# Altium footprint library MyPcbLib.PcbLib: 237 footprints (part 3 of 15)
Each footprint in its own frame and in the unit in brackets; x right, y up, seen from the top. Pads: shape width x height; smd on the part's side, far side on the other; paste and mask are expansions set on the pad; w line width, h text height; cw(c..) or ccw(c..) is an arc to the next point about the centre after c.
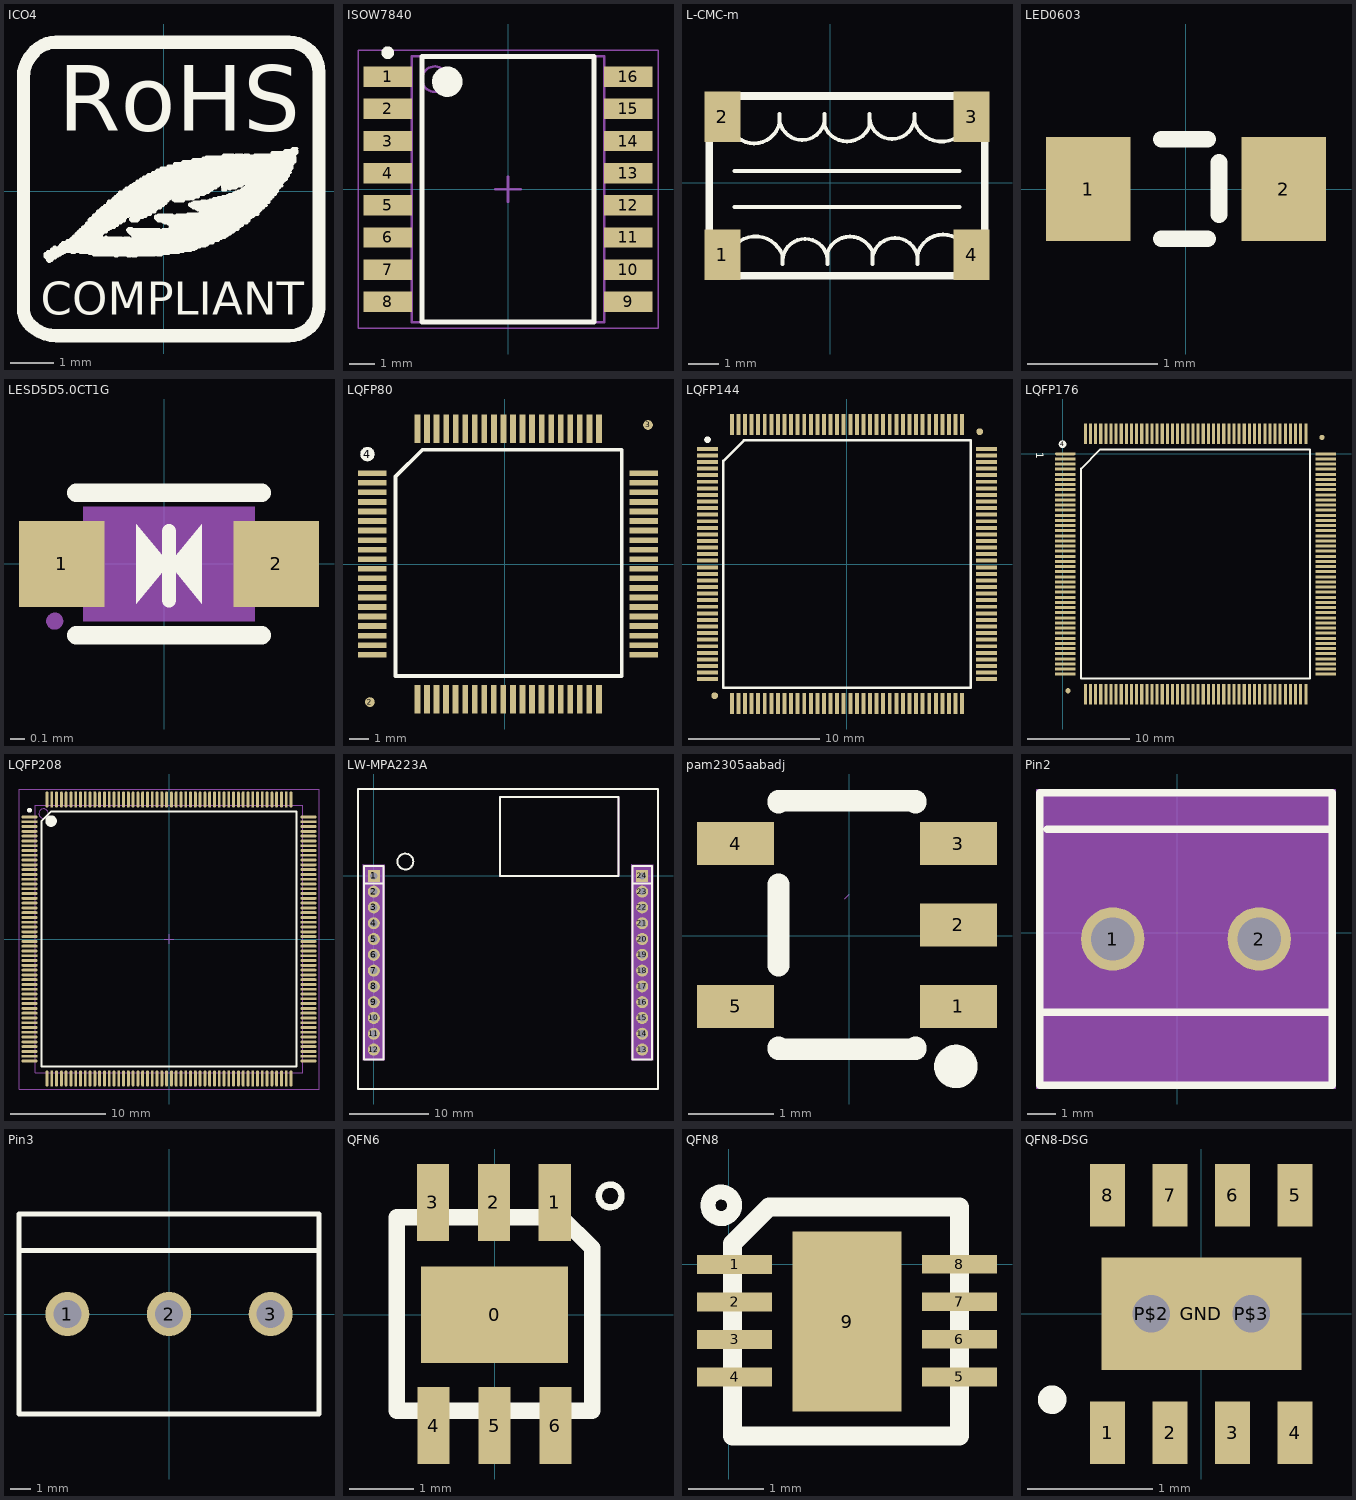
[diagram p2: the footprints below, top view; thin cyan lines are the x and y axes]

## ICO4 [mm]
Top Overlay:
  drawing of 1541 lines, arcs and shapes, not listed
  text "COMPLIANT" at -2.845,-2.869 h0.76
  text "RoHS" at -2.438,1.398 h1.52

## ISOW7840 [mm] "SOIC, 16-Leads, Body 10.30x7.50mm, Pitch 1.27mm, IPC Medium Density"
height 2.65
pads (16):
  rect 1.9x0.8 smd: 1(-4.75,4.445) 2(-4.75,3.175) 3(-4.75,1.905) 4(-4.75,0.635) 5(-4.75,-0.635) 6(-4.75,-1.905) 7(-4.75,-3.175) 8(-4.75,-4.445) 9(4.75,-4.445) 10(4.75,-3.175) 11(4.75,-1.905) 12(4.75,-0.635) 13(4.75,0.635) 14(4.75,1.905) 15(4.75,3.175) 16(4.75,4.445)
Top Overlay:
  circle w0.25: c-4.75,5.395 r0.125
  circle w0.6: c-2.4,4.25 r0.3
  lines w0.2: -3.4,-5.25 -3.4,5.25 3.4,5.25 3.4,-5.25 -3.4,-5.25
Mechanical 2:
  circle w0.1: c-2.9,4.35 r0.5
  lines w0.1: -3.8,-5.25 -3.8,5.25 3.8,5.25 3.8,-5.25 -3.8,-5.25
Mechanical 6:
  lines w0.05: -5.925,-5.5 -5.925,5.5 5.925,5.5 5.925,-5.5 -5.925,-5.5
  lines w0.1: -0.5,0 0.5,0 ; 0,-0.5 0,0.5
3D body: height 2.65, standoff 0.1, extent -3.8,-5.25 3.8,5.25

## L-CMC-m [mm]
pads (4):
  rect 1.194x1.694 smd: 1(-3.6,-2.4) 2(-3.6,2.2) 3(4.708,2.2) 4(4.708,-2.4)
Top Overlay:
  lines w0.127: -3.394,-2.748 -3.394,-2.433 cw(c-2.494,-2.734) -1.594,-2.433 -1.594,-2.708 cw(c-0.844,-2.625) -0.094,-2.708 -0.094,-2.308 ; -3.394,2.459 -3.394,1.992 ccw(c-2.544,2.182) -1.694,1.992 -1.694,2.292 ccw(c-0.944,2.183) -0.194,2.292 -0.194,1.892 ; -3.194,-0.808 4.306,-0.808 ; -3.194,0.392 4.306,0.392 ; -0.194,1.891 ccw(c0.556,2.182) 1.306,1.893 1.306,2.292 ccw(c2.056,2.209) 2.806,2.292 2.806,2.017 ; -0.094,-2.308 cw(c0.656,-2.598) 1.405,-2.307 1.406,-2.708 cw(c2.156,-2.598) 2.906,-2.708 2.906,-2.407 cw(c3.756,-2.597) 4.606,-2.407 4.606,-2.748 ; 2.806,2.016 ccw(c3.706,2.317) 4.606,2.018 ; 4.606,2.017 4.606,2.459
  lines w0.254: -4.042,-3.103 5.152,-3.103 5.152,2.891 -4.042,2.891 -4.042,-3.103

## LED0603 [mm]
pads (2):
  rect 0.65x0.8 smd: 1(-0.75,0) 2(0.75,0)
Top Overlay:
  lines w0.127: -0.19,-0.383 0.165,-0.383 ; -0.19,0.383 0.165,0.383 ; 0.253,-0.196 0.253,0.204
3D body "LED-0603.STEP": height 0.52, standoff -0.03, extent -0.851,-0.387 0.8,0.413

## LESD5D5.0CT1G [mm]
pads (2):
  rect 0.6x0.6 smd: 1(-0.716,0) 2(0.784,0)
Top Overlay:
  region: 0.034,0 -0.195,-0.279 -0.195,0.279
  region: 0.034,0 0.263,0.279 0.263,-0.279
  lines w0.1: 0.034,-0.254 0.034,0.229
  lines w0.13: -0.616,-0.5 0.684,-0.5 ; -0.616,0.5 0.684,0.5
Mechanical 4:
  region: -0.566,-0.4 -0.566,0.4 0.634,0.4 0.634,-0.4
Mechanical 5:
  region: -0.766,0.15 -0.429,0.15 -0.429,-0.15 -0.766,-0.15
  region: 0.834,-0.152 0.497,-0.152 0.497,0.148 0.834,0.148
Mechanical 6:
  circle w0.06: c-0.766,-0.4 r0.03
Mechanical 15:
  region: 0.263,0.279 0.263,-0.279 0.034,0
  region: -0.195,0.279 -0.195,-0.279 0.034,0

## LQFP80 [mm]
pads (83):
  rect 1.5x0.3 smd: 1(-6.934,4.763) 2(-6.934,4.263) 3(-6.934,3.763) 4(-6.934,3.263) 5(-6.934,2.763) 6(-6.934,2.263) 7(-6.934,1.763) 8(-6.934,1.263) 9(-6.934,0.763) 10(-6.934,0.263) 11(-6.934,-0.237) 12(-6.934,-0.737) 13(-6.934,-1.237) 14(-6.934,-1.737) 15(-6.934,-2.237) 16(-6.934,-2.737) 17(-6.934,-3.237) 18(-6.934,-3.737) 19(-6.934,-4.237) 20(-6.934,-4.737) 41(7.266,-4.737) 42(7.266,-4.237) 43(7.266,-3.737) 44(7.266,-3.237) 45(7.266,-2.737) 46(7.266,-2.237) 47(7.266,-1.737) 48(7.266,-1.237) 49(7.266,-0.737) 50(7.266,-0.237) 51(7.266,0.263) 52(7.266,0.763) 53(7.266,1.263) 54(7.266,1.763) 55(7.266,2.263) 56(7.266,2.763) 57(7.266,3.263) 58(7.266,3.763) 59(7.266,4.263) 60(7.266,4.763)
  round 0.508 smd: 2(-7.061,-7.214) 3(7.493,7.29)
  round 0.762 on Top Overlay: 4(-7.188,5.766)
  rect 0.3x1.5 smd: 21(-4.576,-7.074) 22(-4.076,-7.074) 23(-3.576,-7.074) 24(-3.076,-7.074) 25(-2.576,-7.074) 26(-2.076,-7.074) 27(-1.576,-7.074) 28(-1.076,-7.074) 29(-0.576,-7.074) 30(-0.076,-7.074) 31(0.424,-7.074) 32(0.924,-7.074) 33(1.424,-7.074) 34(1.924,-7.074) 35(2.424,-7.074) 36(2.924,-7.074) 37(3.424,-7.074) 38(3.924,-7.074) 39(4.424,-7.074) 40(4.924,-7.074) 61(4.928,7.099) 62(4.428,7.099) 63(3.928,7.099) 64(3.428,7.099) 65(2.928,7.099) 66(2.428,7.099) 67(1.928,7.099) 68(1.428,7.099) 69(0.928,7.099) 70(0.428,7.099) 71(-0.072,7.099) 72(-0.572,7.099) 73(-1.072,7.099) 74(-1.572,7.099) 75(-2.072,7.099) 76(-2.572,7.099) 77(-3.072,7.099) 78(-3.572,7.099) 79(-4.072,7.099) 80(-4.572,7.099)
Top Overlay:
  lines w0.2: -5.715,-5.855 6.121,-5.855 6.121,5.994 -4.305,5.994 -5.715,4.585 -5.715,-5.855
3D body "LQFP-80.step": height 1.73, standoff 0.09, extent -6.936,-7.087 7.264,7.113

## LQFP144 [mm]
pads (146):
  rect 1.6x0.3 smd: 1(-10.6,8.75) 2(-10.6,8.25) 3(-10.6,7.75) 4(-10.6,7.25) 5(-10.6,6.75) 6(-10.6,6.25) 7(-10.6,5.75) 8(-10.6,5.25) 9(-10.6,4.75) 10(-10.6,4.25) 11(-10.6,3.75) 12(-10.6,3.25) 13(-10.6,2.75) 14(-10.6,2.25) 15(-10.6,1.75) 16(-10.6,1.25) 17(-10.6,0.75) 18(-10.6,0.25) 19(-10.6,-0.25) 20(-10.6,-0.75) 21(-10.6,-1.25) 22(-10.6,-1.75) 23(-10.6,-2.25) 24(-10.6,-2.75) 25(-10.6,-3.25) 26(-10.6,-3.75) 27(-10.6,-4.25) 28(-10.6,-4.75) 29(-10.6,-5.25) 30(-10.6,-5.75) 31(-10.6,-6.25) 32(-10.6,-6.75) 33(-10.6,-7.25) 34(-10.6,-7.75) 35(-10.6,-8.25) 36(-10.6,-8.75) 73(10.6,-8.75) 74(10.6,-8.25) 75(10.6,-7.75) 76(10.6,-7.25) 77(10.6,-6.75) 78(10.6,-6.25) 79(10.6,-5.75) 80(10.6,-5.25) 81(10.6,-4.75) 82(10.6,-4.25) 83(10.6,-3.75) 84(10.6,-3.25) 85(10.6,-2.75) 86(10.6,-2.25) 87(10.6,-1.75) 88(10.6,-1.25) 89(10.6,-0.75) 90(10.6,-0.25) 91(10.6,0.25) 92(10.6,0.75) 93(10.6,1.25) 94(10.6,1.75) 95(10.6,2.25) 96(10.6,2.75) 97(10.6,3.25) 98(10.6,3.75) 99(10.6,4.25) 100(10.6,4.75) 101(10.6,5.25) 102(10.6,5.75) 103(10.6,6.25) 104(10.6,6.75) 105(10.6,7.25) 106(10.6,7.75) 107(10.6,8.25) 108(10.6,8.75)
  round 0.508 smd: 6(10.084,10.058) 7(-10.058,-10.008)
  rect 0.3x1.6 smd: 37(-8.75,-10.6) 38(-8.25,-10.6) 39(-7.75,-10.6) 40(-7.25,-10.6) 41(-6.75,-10.6) 42(-6.25,-10.6) 43(-5.75,-10.6) 44(-5.25,-10.6) 45(-4.75,-10.6) 46(-4.25,-10.6) 47(-3.75,-10.6) 48(-3.25,-10.6) 49(-2.75,-10.6) 50(-2.25,-10.6) 51(-1.75,-10.6) 52(-1.25,-10.6) 53(-0.75,-10.6) 54(-0.25,-10.6) 55(0.25,-10.6) 56(0.75,-10.6) 57(1.25,-10.6) 58(1.75,-10.6) 59(2.25,-10.6) 60(2.75,-10.6) 61(3.25,-10.6) 62(3.75,-10.6) 63(4.25,-10.6) 64(4.75,-10.6) 65(5.25,-10.6) 66(5.75,-10.6) 67(6.25,-10.6) 68(6.75,-10.6) 69(7.25,-10.6) 70(7.75,-10.6) 71(8.25,-10.6) 72(8.75,-10.6) 109(8.75,10.6) 110(8.25,10.6) 111(7.75,10.6) 112(7.25,10.6) 113(6.75,10.6) 114(6.25,10.6) 115(5.75,10.6) 116(5.25,10.6) 117(4.75,10.6) 118(4.25,10.6) 119(3.75,10.6) 120(3.25,10.6) 121(2.75,10.6) 122(2.25,10.6) 123(1.75,10.6) 124(1.25,10.6) 125(0.75,10.6) 126(0.25,10.6) 127(-0.25,10.6) 128(-0.75,10.6) 129(-1.25,10.6) 130(-1.75,10.6) 131(-2.25,10.6) 132(-2.75,10.6) 133(-3.25,10.6) 134(-3.75,10.6) 135(-4.25,10.6) 136(-4.75,10.6) 137(-5.25,10.6) 138(-5.75,10.6) 139(-6.25,10.6) 140(-6.75,10.6) 141(-7.25,10.6) 142(-7.75,10.6) 143(-8.25,10.6) 144(-8.75,10.6)
Top Overlay:
  circle w0.25: c-10.6,9.45 r0.125
  lines w0.2: -9.4,-9.4 9.4,-9.4 9.4,9.4 -7.847,9.4 -9.4,7.847 -9.4,-9.4
3D body "TQFP144.STEP": height 1.1, standoff 0, extent -10.983,-11.009 11.034,11.009

## LQFP176 [mm]
pads (179):
  oval 2x0.3 smd: 1(0.254,0)
  rect 2x0.3 smd: 2(0.254,-0.5) 3(0.254,-1) 4(0.254,-1.5) 5(0.254,-2) 6(0.254,-2.5) 7(0.254,-3) 8(0.254,-3.5) 9(0.254,-4) 10(0.254,-4.5) 11(0.254,-5) 12(0.254,-5.5) 13(0.254,-6) 14(0.254,-6.5) 15(0.254,-7) 16(0.254,-7.5) 17(0.254,-8) 18(0.254,-8.5) 19(0.254,-9) 20(0.254,-9.5) 21(0.254,-10) 22(0.254,-10.5) 23(0.254,-11) 24(0.254,-11.5) 25(0.254,-12) 26(0.254,-12.5) 27(0.254,-13) 28(0.254,-13.5) 29(0.254,-14) 30(0.254,-14.5) 31(0.254,-15) 32(0.254,-15.5) 33(0.254,-16) 34(0.254,-16.5) 35(0.254,-17) 36(0.254,-17.5) 37(0.254,-18) 38(0.254,-18.5) 39(0.254,-19) 40(0.254,-19.5) 41(0.254,-20) 42(0.254,-20.5) 43(0.254,-21) 44(0.254,-21.5) 89(25.646,-21.5) 90(25.646,-21) 91(25.646,-20.5) 92(25.646,-20) 93(25.646,-19.5) 94(25.646,-19) 95(25.646,-18.5) 96(25.646,-18) 97(25.646,-17.5) 98(25.646,-17) 99(25.646,-16.5) 100(25.646,-16) 101(25.646,-15.5) 102(25.646,-15) 103(25.646,-14.5) 104(25.646,-14) 105(25.646,-13.5) 106(25.646,-13) 107(25.646,-12.5) 108(25.646,-12) 109(25.646,-11.5) 110(25.646,-11) 111(25.646,-10.5) 112(25.646,-10) 113(25.646,-9.5) 114(25.646,-9) 115(25.646,-8.5) 116(25.646,-8) 117(25.646,-7.5) 118(25.646,-7) 119(25.646,-6.5) 120(25.646,-6) 121(25.646,-5.5) 122(25.646,-5) 123(25.646,-4.5) 124(25.646,-4) 125(25.646,-3.5) 126(25.646,-3) 127(25.646,-2.5) 128(25.646,-2) 129(25.646,-1.5) 130(25.646,-1) 131(25.646,-0.5) 132(25.646,0)
  round 0.508 smd: 2(25.273,1.6) 3(0.508,-23.114)
  round 0.762 on Top Overlay: 4(-0.025,0.94)
  rect 0.3x2 smd: 45(2.2,-23.446) 46(2.7,-23.446) 47(3.2,-23.446) 48(3.7,-23.446) 49(4.2,-23.446) 50(4.7,-23.446) 51(5.2,-23.446) 52(5.7,-23.446) 53(6.2,-23.446) 54(6.7,-23.446) 55(7.2,-23.446) 56(7.7,-23.446) 57(8.2,-23.446) 58(8.7,-23.446) 59(9.2,-23.446) 60(9.7,-23.446) 61(10.2,-23.446) 62(10.7,-23.446) 63(11.2,-23.446) 64(11.7,-23.446) 65(12.2,-23.446) 66(12.7,-23.446) 67(13.2,-23.446) 68(13.7,-23.446) 69(14.2,-23.446) 70(14.7,-23.446) 71(15.2,-23.446) 72(15.7,-23.446) 73(16.2,-23.446) 74(16.7,-23.446) 75(17.2,-23.446) 76(17.7,-23.446) 77(18.2,-23.446) 78(18.7,-23.446) 79(19.2,-23.446) 80(19.7,-23.446) 81(20.2,-23.446) 82(20.7,-23.446) 83(21.2,-23.446) 84(21.7,-23.446) 85(22.2,-23.446) 86(22.7,-23.446) 87(23.2,-23.446) 88(23.7,-23.446) 133(23.7,1.946) 134(23.2,1.946) 135(22.7,1.946) 136(22.2,1.946) 137(21.7,1.946) 138(21.2,1.946) 139(20.7,1.946) 140(20.2,1.946) 141(19.7,1.946) 142(19.2,1.946) 143(18.7,1.946) 144(18.2,1.946) 145(17.7,1.946) 146(17.2,1.946) 147(16.7,1.946) 148(16.2,1.946) 149(15.7,1.946) 150(15.2,1.946) 151(14.7,1.946) 152(14.2,1.946) 153(13.7,1.946) 154(13.2,1.946) 155(12.7,1.946) 156(12.2,1.946) 157(11.7,1.946) 158(11.2,1.946) 159(10.7,1.946) 160(10.2,1.946) 161(9.7,1.946) 162(9.2,1.946) 163(8.7,1.946) 164(8.2,1.946) 165(7.7,1.946) 166(7.2,1.946) 167(6.7,1.946) 168(6.2,1.946) 169(5.7,1.946) 170(5.2,1.946) 171(4.7,1.946) 172(4.2,1.946) 173(3.7,1.946) 174(3.2,1.946) 175(2.7,1.946) 176(2.2,1.946)
Top Overlay:
  lines w0.2: 24.079,0.432 3.658,0.432 1.785,-1.441 1.785,-21.915 24.115,-21.915 24.115,0.415
  text "1" at -2.616,0.127 h0.76
3D body "TQFP176.STEP": height 1.1, standoff 0, extent -0.055,-23.753 25.963,2.265

## LQFP208 [mm] "TSQFP, 208-Leads, Body 28.00x28.00mm, Pitch 0.50mm, IPC Medium Density"
height 1.6
pads (208):
  oval 1.7x0.3 smd: 1(-14.575,12.75) 2(-14.575,12.25) 3(-14.575,11.75) 4(-14.575,11.25) 5(-14.575,10.75) 6(-14.575,10.25) 7(-14.575,9.75) 8(-14.575,9.25) 9(-14.575,8.75) 10(-14.575,8.25) 11(-14.575,7.75) 12(-14.575,7.25) 13(-14.575,6.75) 14(-14.575,6.25) 15(-14.575,5.75) 16(-14.575,5.25) 17(-14.575,4.75) 18(-14.575,4.25) 19(-14.575,3.75) 20(-14.575,3.25) 21(-14.575,2.75) 22(-14.575,2.25) 23(-14.575,1.75) 24(-14.575,1.25) 25(-14.575,0.75) 26(-14.575,0.25) 27(-14.575,-0.25) 28(-14.575,-0.75) 29(-14.575,-1.25) 30(-14.575,-1.75) 31(-14.575,-2.25) 32(-14.575,-2.75) 33(-14.575,-3.25) 34(-14.575,-3.75) 35(-14.575,-4.25) 36(-14.575,-4.75) 37(-14.575,-5.25) 38(-14.575,-5.75) 39(-14.575,-6.25) 40(-14.575,-6.75) 41(-14.575,-7.25) 42(-14.575,-7.75) 43(-14.575,-8.25) 44(-14.575,-8.75) 45(-14.575,-9.25) 46(-14.575,-9.75) 47(-14.575,-10.25) 48(-14.575,-10.75) 49(-14.575,-11.25) 50(-14.575,-11.75) 51(-14.575,-12.25) 52(-14.575,-12.75) 105(14.575,-12.75) 106(14.575,-12.25) 107(14.575,-11.75) 108(14.575,-11.25) 109(14.575,-10.75) 110(14.575,-10.25) 111(14.575,-9.75) 112(14.575,-9.25) 113(14.575,-8.75) 114(14.575,-8.25) 115(14.575,-7.75) 116(14.575,-7.25) 117(14.575,-6.75) 118(14.575,-6.25) 119(14.575,-5.75) 120(14.575,-5.25) 121(14.575,-4.75) 122(14.575,-4.25) 123(14.575,-3.75) 124(14.575,-3.25) 125(14.575,-2.75) 126(14.575,-2.25) 127(14.575,-1.75) 128(14.575,-1.25) 129(14.575,-0.75) 130(14.575,-0.25) 131(14.575,0.25) 132(14.575,0.75) 133(14.575,1.25) 134(14.575,1.75) 135(14.575,2.25) 136(14.575,2.75) 137(14.575,3.25) 138(14.575,3.75) 139(14.575,4.25) 140(14.575,4.75) 141(14.575,5.25) 142(14.575,5.75) 143(14.575,6.25) 144(14.575,6.75) 145(14.575,7.25) 146(14.575,7.75) 147(14.575,8.25) 148(14.575,8.75) 149(14.575,9.25) 150(14.575,9.75) 151(14.575,10.25) 152(14.575,10.75) 153(14.575,11.25) 154(14.575,11.75) 155(14.575,12.25) 156(14.575,12.75)
  oval 0.3x1.7 smd: 53(-12.75,-14.575) 54(-12.25,-14.575) 55(-11.75,-14.575) 56(-11.25,-14.575) 57(-10.75,-14.575) 58(-10.25,-14.575) 59(-9.75,-14.575) 60(-9.25,-14.575) 61(-8.75,-14.575) 62(-8.25,-14.575) 63(-7.75,-14.575) 64(-7.25,-14.575) 65(-6.75,-14.575) 66(-6.25,-14.575) 67(-5.75,-14.575) 68(-5.25,-14.575) 69(-4.75,-14.575) 70(-4.25,-14.575) 71(-3.75,-14.575) 72(-3.25,-14.575) 73(-2.75,-14.575) 74(-2.25,-14.575) 75(-1.75,-14.575) 76(-1.25,-14.575) 77(-0.75,-14.575) 78(-0.25,-14.575) 79(0.25,-14.575) 80(0.75,-14.575) 81(1.25,-14.575) 82(1.75,-14.575) 83(2.25,-14.575) 84(2.75,-14.575) 85(3.25,-14.575) 86(3.75,-14.575) 87(4.25,-14.575) 88(4.75,-14.575) 89(5.25,-14.575) 90(5.75,-14.575) 91(6.25,-14.575) 92(6.75,-14.575) 93(7.25,-14.575) 94(7.75,-14.575) 95(8.25,-14.575) 96(8.75,-14.575) 97(9.25,-14.575) 98(9.75,-14.575) 99(10.25,-14.575) 100(10.75,-14.575) 101(11.25,-14.575) 102(11.75,-14.575) 103(12.25,-14.575) 104(12.75,-14.575) 157(12.75,14.575) 158(12.25,14.575) 159(11.75,14.575) 160(11.25,14.575) 161(10.75,14.575) 162(10.25,14.575) 163(9.75,14.575) 164(9.25,14.575) 165(8.75,14.575) 166(8.25,14.575) 167(7.75,14.575) 168(7.25,14.575) 169(6.75,14.575) 170(6.25,14.575) 171(5.75,14.575) 172(5.25,14.575) 173(4.75,14.575) 174(4.25,14.575) 175(3.75,14.575) 176(3.25,14.575) 177(2.75,14.575) 178(2.25,14.575) 179(1.75,14.575) 180(1.25,14.575) 181(0.75,14.575) 182(0.25,14.575) 183(-0.25,14.575) 184(-0.75,14.575) 185(-1.25,14.575) 186(-1.75,14.575) 187(-2.25,14.575) 188(-2.75,14.575) 189(-3.25,14.575) 190(-3.75,14.575) 191(-4.25,14.575) 192(-4.75,14.575) 193(-5.25,14.575) 194(-5.75,14.575) 195(-6.25,14.575) 196(-6.75,14.575) 197(-7.25,14.575) 198(-7.75,14.575) 199(-8.25,14.575) 200(-8.75,14.575) 201(-9.25,14.575) 202(-9.75,14.575) 203(-10.25,14.575) 204(-10.75,14.575) 205(-11.25,14.575) 206(-11.75,14.575) 207(-12.25,14.575) 208(-12.75,14.575)
Top Overlay:
  circle w0.25: c-14.575,13.45 r0.125
  circle w0.6: c-12.325,12.325 r0.3
  lines w0.2: -13.325,-13.325 13.325,-13.325 13.325,13.325 -12.329,13.325 -13.325,12.329 -13.325,-13.325
Mechanical 13:
  circle w0.1: c-13.1,13.1 r0.5
  lines w0.1: -14,-14 -14,14 14,14 14,-14 -14,-14
Mechanical 15:
  lines w0.05: -15.675,-15.675 -15.675,15.675 15.675,15.675 15.675,-15.675 -15.675,-15.675
  lines w0.1: -0.5,0 0.5,0 ; 0,-0.5 0,0.5
3D body "PQ208.STEP": height 4.15, standoff -0.08, extent -15.309,-15.249 15.291,15.351

## LW-MPA223A [mil]
pads (24):
  rect 60x60 hole 35.43: 1(0,0) 24(1338.58,0)
  round 60 hole 35.43: 2(0,-78.8) 3(0,-157.5) 4(0,-236.3) 5(0,-315) 6(0,-393.7) 7(0,-472.5) 8(0,-551.2) 9(0,-630) 10(0,-708.7) 11(0,-787.4) 12(0,-866.2) 13(1338.58,-866.2) 14(1338.58,-787.4) 15(1338.58,-708.7) 16(1338.58,-630) 17(1338.58,-551.2) 18(1338.58,-472.5) 19(1338.58,-393.7) 20(1338.58,-315) 21(1338.58,-236.3) 22(1338.58,-157.5) 23(1338.58,-78.8)
Top Overlay:
  circle w10: c157.48,71.26 r39.37
  lines w10: -49.21,-39.36 49.21,-39.36 ; 1289.37,-39.36 1387.79,-39.36 ; -78.74,-1062.99 -78.74,433.07 1417.32,433.07 1417.32,-1062.99 1377.95,-1062.99 0,-1062.99 -78.74,-1062.99 ; -49.21,-915.38 -49.21,49.18 49.21,49.18 49.2,-591 49.2,-915.4 -49.21,-915.38 ; 629.92,0 1220.47,0 1220.47,393.7 629.92,393.7 629.92,0 ; 1289.37,-915.38 1387.79,-915.38 1387.78,-591 1387.78,49.2 1289.37,49.18 1289.37,-915.38
Mechanical 1:
  lines w10: 629.92,0 629.92,393.7 1220.47,393.7 1220.47,0 629.92,0
Mechanical 4:
  region: 54.21,54.2 54.21,-920.4 -54.21,-920.4 -54.21,54.2
  region: 1392.79,54.2 1392.79,-920.4 1284.37,-920.4 1284.37,54.2
Mechanical 5:
  circle w13.78: c0,-866.2 r6.89
  circle w13.78: c0,-787.4 r6.89
  circle w13.78: c0,-708.7 r6.89
  circle w13.78: c0,-630 r6.89
  circle w13.78: c0,-551.2 r6.89
  circle w13.78: c0,-472.5 r6.89
  circle w13.78: c0,-393.7 r6.89
  circle w13.78: c0,-315 r6.89
  circle w13.78: c0,-236.3 r6.89
  circle w13.78: c0,-157.5 r6.89
  circle w13.78: c0,-78.8 r6.89
  circle w13.78: c0,0 r6.89
  circle w13.78: c1338.58,0 r6.89
  circle w13.78: c1338.58,-78.8 r6.89
  circle w13.78: c1338.58,-157.5 r6.89
  circle w13.78: c1338.58,-236.3 r6.89
  circle w13.78: c1338.58,-315 r6.89
  circle w13.78: c1338.58,-393.7 r6.89
  circle w13.78: c1338.58,-472.5 r6.89
  circle w13.78: c1338.58,-551.2 r6.89
  circle w13.78: c1338.58,-630 r6.89
  circle w13.78: c1338.58,-708.7 r6.89
  circle w13.78: c1338.58,-787.4 r6.89
  circle w13.78: c1338.58,-866.2 r6.89
Mechanical 6:
  circle w2.36: c-54.21,54.2 r1.18
  circle w2.36: c1284.37,54.2 r1.18
Mechanical 15:
  lines w0.1: 17.55,-431.51 19.55,-433.51 ; 1356.14,-431.51 1358.14,-433.51

## pam2305aabadj [mm]
pads (5):
  rect 0.9x0.5 smd: 1(1.272,-0.823) 2(1.272,0.127) 3(1.272,1.077) 4(-1.328,1.077) 5(-1.328,-0.823)
Top Overlay:
  circle w0.254: c1.242,-1.524 r0.127
  lines w0.254: -0.828,-1.299 -0.828,-1.323 0.772,-1.323 0.772,-1.299 ; -0.828,-0.347 -0.828,0.601 ; -0.828,1.553 -0.828,1.577 0.772,1.577 0.772,1.553
Mechanical 15:
  lines w0.003: -0.053,0.432 -0.003,0.483

## Pin2 [mm]
pads (2):
  round 2.2 hole 1.5: 1(-2.244,-0.211) 2(2.836,-0.211)
Top Overlay:
  lines w0.254: -4.784,-2.751 5.376,-2.751 ; -4.53,3.599 5.376,3.599 ; -4.784,-5.291 5.376,-5.291 5.376,4.869 -4.784,4.869 -4.784,-5.291
Mechanical 4:
  region: -4.911,4.996 5.503,4.996 5.503,-5.418 -4.911,-5.418
Mechanical 5:
  region: 1.736,0.889 3.936,0.889 3.936,-1.311 1.736,-1.311
  region: -3.344,0.889 -1.144,0.889 -1.144,-1.311 -3.344,-1.311
Mechanical 15:
  lines w0.003: 0.059,0.218 0.11,0.269

## Pin3 [mm]
pads (3):
  round 2.2 hole 1.4: 1(-5.08,0) 2(0,0) 3(5.08,0)
Top Overlay:
  lines w0.254: -7.493,3.175 7.366,3.175 ; -7.5,-5 7.5,-5 7.5,5 -7.5,5 -7.5,-5
Mechanical 15:
  lines w0.003: 0.266,0.364 0.317,0.415

## QFN6 [mm] "SOT-23/SC-74A; 5 Leads; Body 3.1 x 3 mm, inc. leads (LxW max)"
height 1.45
pads (7):
  rect 2.3x1.5 smd: 0(0,0)
  rect 0.5x1.2 smd: 1(0.94,1.753) 2(-0.01,1.753) 3(-0.96,1.753) 4(-0.95,-1.727) 5(0,-1.727) 6(0.95,-1.727)
Top Overlay:
  circle w0.1: c1.804,1.854 r0.177
  lines w0.254: -1.524,-1.499 -1.524,1.524 1.041,1.524 1.524,1.041 1.524,-1.499 -1.524,-1.499
3D body: height 1, standoff 0, extent -1.524,-1.499 1.524,1.524

## QFN8 [mm] "SOT-23/SC-74A; 5 Leads; Body 3.1 x 3 mm, inc. leads (LxW max)"
height 1.45
pads (9):
  rect 1x0.25 smd: 1(0.076,0) 2(0.076,-0.5) 3(0.076,-1) 5(3.073,-1.499) 6(3.073,-0.999) 7(3.073,-0.499) 8(3.073,0.001)
  rect 1x0.25 smd paste+0: 4(0.076,-1.5)
  rect 1.45x2.4 smd: 9(1.575,-0.762)
Top Overlay:
  circle w0.2: c-0.101,0.787 r0.177
  lines w0.254: 0.051,-2.286 0.051,0.279 0.533,0.762 3.073,0.762 3.073,-2.286 0.051,-2.286
3D body: height 1, standoff 0, extent 0.051,-2.286 3.073,0.762

## QFN8-DSG [mm]
pads (11):
  rect 0.28x0.5 smd: 1(-0.75,-0.95) 2(-0.25,-0.95) 3(0.25,-0.95) 4(0.75,-0.95) 5(0.75,0.95) 6(0.25,0.95) 7(-0.25,0.95) 8(-0.75,0.95)
  rect 1.6x0.9 smd: GND(0,0)
  rect 0.55x0.55 hole 0.3: P$2(-0.4,0) P$3(0.4,0)
Top Overlay:
  circle w0.127: c-1.194,-0.686 r0.051
3D body "User Library-DSG (S-PWSON-N8).step": height 0.76, standoff -0.04, extent -1.05,-1.041 1.05,1.059